# Altium integrated library WCAP-AIE8_rev15a.intlib: 24 symbols
Pins are listed as number, name and electrical type; pins without a type are passive.

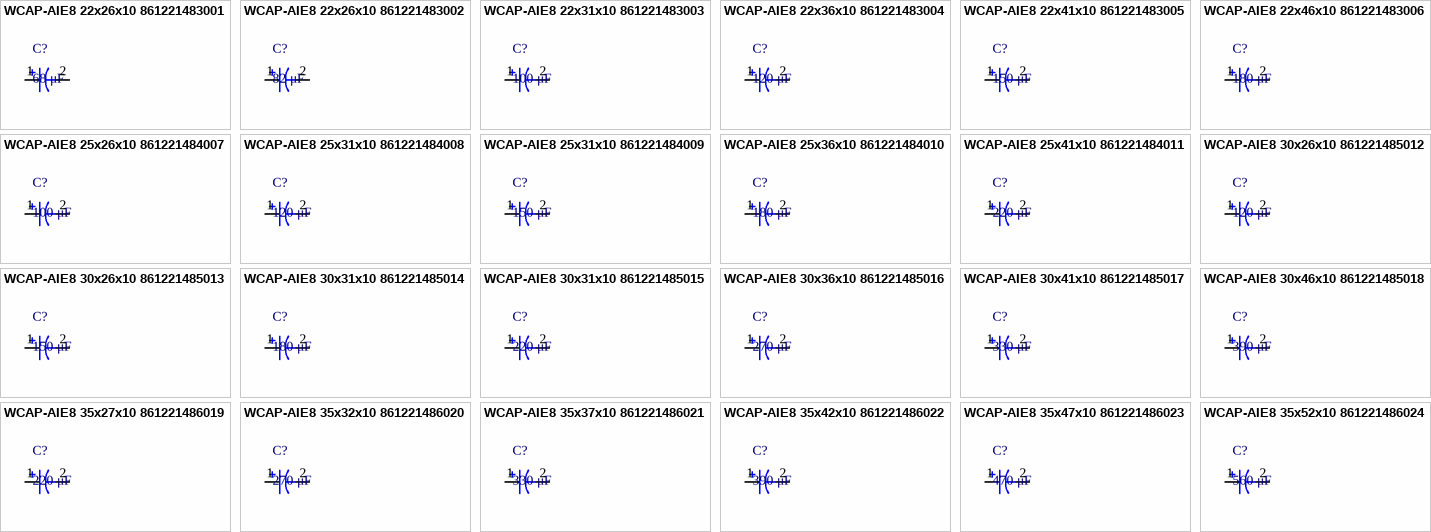
[diagram p0: symbols WCAP-AIE8 22x26x10 861221483001 to WCAP-AIE8 35x52x10 861221486024]

## WCAP-AIE8 22x26x10 861221483001
designator C?, comment 68 μF
WCAP-AIE8 Aluminum Electrolytic Capacitors , 68 μF; + / - 20%; 450 V , 22 x 26; Manufacturer: Wurth Elektronik; partNo: 861221483001; E-mail: libraries@we-online.com; Characteristics: Aluminum Electrolytic Capacitor; Recommended soldering: Wave; Operating temperature: –25 °C to +85 °C; Extended lifetime product series; Load life: 3000 h @ +85 °C; ComponentLink1Description: Manufacturer; ComponentLink1URL: http://www.we-online.com; ComponentLink2Description: Datasheet; ComponentLink2URL: http://katalog.we-online.de/pbs/datasheet/861221483001.pdf; Created by: Karrer Zheng; Created Date: 6/8/2015; Capacitance: 68 μF; Application: Medium and high voltage type range from 160V-450V used as primary side input filter in power supply, which can be used in general switching power supply, PC power supply and industrial computer power supply,server power supply, AC-DC converter, motor drive circuit DC storage filter, digital audio, digital TV, communication base station, DC-AC inverter, inverter power supply and converters etc
footprint WCAP-AIE8 22x26x10
pins: 1, 2

## WCAP-AIE8 22x26x10 861221483002
designator C?, comment 82 μF
WCAP-AIE8 Aluminum Electrolytic Capacitors , 82 μF; + / - 20%; 450 V , 22 x 26; Manufacturer: Wurth Elektronik; partNo: 861221483002; E-mail: libraries@we-online.com; Characteristics: Aluminum Electrolytic Capacitor; Recommended soldering: Wave; Operating temperature: –25 °C to +85 °C; Extended lifetime product series; Load life: 3000 h @ +85 °C; ComponentLink1Description: Manufacturer; ComponentLink1URL: http://www.we-online.com; ComponentLink2Description: Datasheet; ComponentLink2URL: http://katalog.we-online.de/pbs/datasheet/861221483002.pdf; Created by: Karrer Zheng; Created Date: 6/8/2015; Capacitance: 82 μF; Application: Medium and high voltage type range from 160V-450V used as primary side input filter in power supply, which can be used in general switching power supply, PC power supply and industrial computer power supply,server power supply, AC-DC converter, motor drive circuit DC storage filter, digital audio, digital TV, communication base station, DC-AC inverter, inverter power supply and converters etc
footprint WCAP-AIE8 22x26x10
pins: 1, 2

## WCAP-AIE8 22x31x10 861221483003
designator C?, comment 100 μF
WCAP-AIE8 Aluminum Electrolytic Capacitors , 100 μF; + / - 20%; 450 V , 22 x 31; Manufacturer: Wurth Elektronik; partNo: 861221483003; E-mail: libraries@we-online.com; Characteristics: Aluminum Electrolytic Capacitor; Recommended soldering: Wave; Operating temperature: –25 °C to +85 °C; Extended lifetime product series; Load life: 3000 h @ +85 °C; ComponentLink1Description: Manufacturer; ComponentLink1URL: http://www.we-online.com; ComponentLink2Description: Datasheet; ComponentLink2URL: http://katalog.we-online.de/pbs/datasheet/861221483003.pdf; Created by: Karrer Zheng; Created Date: 6/8/2015; Capacitance: 100 μF; Application: Medium and high voltage type range from 160V-450V used as primary side input filter in power supply, which can be used in general switching power supply, PC power supply and industrial computer power supply,server power supply, AC-DC converter, motor drive circuit DC storage filter, digital audio, digital TV, communication base station, DC-AC inverter, inverter power supply and converters etc
footprint WCAP-AIE8 22x31x10
pins: 1, 2

## WCAP-AIE8 22x36x10 861221483004
designator C?, comment 120 μF
WCAP-AIE8 Aluminum Electrolytic Capacitors , 120 μF; + / - 20%; 450 V , 22 x 36; Manufacturer: Wurth Elektronik; partNo: 861221483004; E-mail: libraries@we-online.com; Characteristics: Aluminum Electrolytic Capacitor; Recommended soldering: Wave; Operating temperature: –25 °C to +85 °C; Extended lifetime product series; Load life: 3000 h @ +85 °C; ComponentLink1Description: Manufacturer; ComponentLink1URL: http://www.we-online.com; ComponentLink2Description: Datasheet; ComponentLink2URL: http://katalog.we-online.de/pbs/datasheet/861221483004.pdf; Created by: Karrer Zheng; Created Date: 6/8/2015; Capacitance: 120 μF; Application: Medium and high voltage type range from 160V-450V used as primary side input filter in power supply, which can be used in general switching power supply, PC power supply and industrial computer power supply,server power supply, AC-DC converter, motor drive circuit DC storage filter, digital audio, digital TV, communication base station, DC-AC inverter, inverter power supply and converters etc
footprint WCAP-AIE8 22x36x10
pins: 1, 2

## WCAP-AIE8 22x41x10 861221483005
designator C?, comment 150 μF
WCAP-AIE8 Aluminum Electrolytic Capacitors , 150 μF; + / - 20%; 450 V , 22 x 41; Manufacturer: Wurth Elektronik; partNo: 861221483005; E-mail: libraries@we-online.com; Characteristics: Aluminum Electrolytic Capacitor; Recommended soldering: Wave; Operating temperature: –25 °C to +85 °C; Extended lifetime product series; Load life: 3000 h @ +85 °C; ComponentLink1Description: Manufacturer; ComponentLink1URL: http://www.we-online.com; ComponentLink2Description: Datasheet; ComponentLink2URL: http://katalog.we-online.de/pbs/datasheet/861221483005.pdf; Created by: Karrer Zheng; Created Date: 6/8/2015; Capacitance: 150 μF; Application: Medium and high voltage type range from 160V-450V used as primary side input filter in power supply, which can be used in general switching power supply, PC power supply and industrial computer power supply,server power supply, AC-DC converter, motor drive circuit DC storage filter, digital audio, digital TV, communication base station, DC-AC inverter, inverter power supply and converters etc
footprint WCAP-AIE8 22x41x10
pins: 1, 2

## WCAP-AIE8 22x46x10 861221483006
designator C?, comment 180 μF
WCAP-AIE8 Aluminum Electrolytic Capacitors , 180 μF; + / - 20%; 450 V , 22 x 46; Manufacturer: Wurth Elektronik; partNo: 861221483006; E-mail: libraries@we-online.com; Characteristics: Aluminum Electrolytic Capacitor; Recommended soldering: Wave; Operating temperature: –25 °C to +85 °C; Extended lifetime product series; Load life: 3000 h @ +85 °C; ComponentLink1Description: Manufacturer; ComponentLink1URL: http://www.we-online.com; ComponentLink2Description: Datasheet; ComponentLink2URL: http://katalog.we-online.de/pbs/datasheet/861221483006.pdf; Created by: Karrer Zheng; Created Date: 6/8/2015; Capacitance: 180 μF; Application: Medium and high voltage type range from 160V-450V used as primary side input filter in power supply, which can be used in general switching power supply, PC power supply and industrial computer power supply,server power supply, AC-DC converter, motor drive circuit DC storage filter, digital audio, digital TV, communication base station, DC-AC inverter, inverter power supply and converters etc
footprint WCAP-AIE8 22x46x10
pins: 1, 2

## WCAP-AIE8 25x26x10 861221484007
designator C?, comment 100 μF
WCAP-AIE8 Aluminum Electrolytic Capacitors , 100 μF; + / - 20%; 450 V , 25 x 26; Manufacturer: Wurth Elektronik; partNo: 861221484007; E-mail: libraries@we-online.com; Characteristics: Aluminum Electrolytic Capacitor; Recommended soldering: Wave; Operating temperature: –25 °C to +85 °C; Extended lifetime product series; Load life: 3000 h @ +85 °C; ComponentLink1Description: Manufacturer; ComponentLink1URL: http://www.we-online.com; ComponentLink2Description: Datasheet; ComponentLink2URL: http://katalog.we-online.de/pbs/datasheet/861221484007.pdf; Created by: Karrer Zheng; Created Date: 6/8/2015; Capacitance: 100 μF; Application: Medium and high voltage type range from 160V-450V used as primary side input filter in power supply, which can be used in general switching power supply, PC power supply and industrial computer power supply,server power supply, AC-DC converter, motor drive circuit DC storage filter, digital audio, digital TV, communication base station, DC-AC inverter, inverter power supply and converters etc
footprint WCAP-AIE8 25x26x10
pins: 1, 2

## WCAP-AIE8 25x31x10 861221484008
designator C?, comment 120 μF
WCAP-AIE8 Aluminum Electrolytic Capacitors , 120 μF; + / - 20%; 450 V , 25 x 31; Manufacturer: Wurth Elektronik; partNo: 861221484008; E-mail: libraries@we-online.com; Characteristics: Aluminum Electrolytic Capacitor; Recommended soldering: Wave; Operating temperature: –25 °C to +85 °C; Extended lifetime product series; Load life: 3000 h @ +85 °C; ComponentLink1Description: Manufacturer; ComponentLink1URL: http://www.we-online.com; ComponentLink2Description: Datasheet; ComponentLink2URL: http://katalog.we-online.de/pbs/datasheet/861221484008.pdf; Created by: Karrer Zheng; Created Date: 6/8/2015; Capacitance: 120 μF; Application: Medium and high voltage type range from 160V-450V used as primary side input filter in power supply, which can be used in general switching power supply, PC power supply and industrial computer power supply,server power supply, AC-DC converter, motor drive circuit DC storage filter, digital audio, digital TV, communication base station, DC-AC inverter, inverter power supply and converters etc
footprint WCAP-AIE8 25x31x10
pins: 1, 2

## WCAP-AIE8 25x31x10 861221484009
designator C?, comment 150 μF
WCAP-AIE8 Aluminum Electrolytic Capacitors , 150 μF; + / - 20%; 450 V , 25 x 31; Manufacturer: Wurth Elektronik; partNo: 861221484009; E-mail: libraries@we-online.com; Characteristics: Aluminum Electrolytic Capacitor; Recommended soldering: Wave; Operating temperature: –25 °C to +85 °C; Extended lifetime product series; Load life: 3000 h @ +85 °C; ComponentLink1Description: Manufacturer; ComponentLink1URL: http://www.we-online.com; ComponentLink2Description: Datasheet; ComponentLink2URL: http://katalog.we-online.de/pbs/datasheet/861221484009.pdf; Created by: Karrer Zheng; Created Date: 6/8/2015; Capacitance: 150 μF; Application: Medium and high voltage type range from 160V-450V used as primary side input filter in power supply, which can be used in general switching power supply, PC power supply and industrial computer power supply,server power supply, AC-DC converter, motor drive circuit DC storage filter, digital audio, digital TV, communication base station, DC-AC inverter, inverter power supply and converters etc
footprint WCAP-AIE8 25x31x10
pins: 1, 2

## WCAP-AIE8 25x36x10 861221484010
designator C?, comment 180 μF
WCAP-AIE8 Aluminum Electrolytic Capacitors , 180 μF; + / - 20%; 450 V , 25 x 36; Manufacturer: Wurth Elektronik; partNo: 861221484010; E-mail: libraries@we-online.com; Characteristics: Aluminum Electrolytic Capacitor; Recommended soldering: Wave; Operating temperature: –25 °C to +85 °C; Extended lifetime product series; Load life: 3000 h @ +85 °C; ComponentLink1Description: Manufacturer; ComponentLink1URL: http://www.we-online.com; ComponentLink2Description: Datasheet; ComponentLink2URL: http://katalog.we-online.de/pbs/datasheet/861221484010.pdf; Created by: Karrer Zheng; Created Date: 6/8/2015; Capacitance: 180 μF; Application: Medium and high voltage type range from 160V-450V used as primary side input filter in power supply, which can be used in general switching power supply, PC power supply and industrial computer power supply,server power supply, AC-DC converter, motor drive circuit DC storage filter, digital audio, digital TV, communication base station, DC-AC inverter, inverter power supply and converters etc
footprint WCAP-AIE8 25x36x10
pins: 1, 2

## WCAP-AIE8 25x41x10 861221484011
designator C?, comment 220 μF
WCAP-AIE8 Aluminum Electrolytic Capacitors , 220 μF; + / - 20%; 450 V , 25 x 41; Manufacturer: Wurth Elektronik; partNo: 861221484011; E-mail: libraries@we-online.com; Characteristics: Aluminum Electrolytic Capacitor; Recommended soldering: Wave; Operating temperature: –25 °C to +85 °C; Extended lifetime product series; Load life: 3000 h @ +85 °C; ComponentLink1Description: Manufacturer; ComponentLink1URL: http://www.we-online.com; ComponentLink2Description: Datasheet; ComponentLink2URL: http://katalog.we-online.de/pbs/datasheet/861221484011.pdf; Created by: Karrer Zheng; Created Date: 6/8/2015; Capacitance: 220 μF; Application: Medium and high voltage type range from 160V-450V used as primary side input filter in power supply, which can be used in general switching power supply, PC power supply and industrial computer power supply,server power supply, AC-DC converter, motor drive circuit DC storage filter, digital audio, digital TV, communication base station, DC-AC inverter, inverter power supply and converters etc
footprint WCAP-AIE8 25x41x10
pins: 1, 2

## WCAP-AIE8 30x26x10 861221485012
designator C?, comment 120 μF
WCAP-AIE8 Aluminum Electrolytic Capacitors , 120 μF; + / - 20%; 450 V , 30 x 26; Manufacturer: Wurth Elektronik; partNo: 861221485012; E-mail: libraries@we-online.com; Characteristics: Aluminum Electrolytic Capacitor; Recommended soldering: Wave; Operating temperature: –25 °C to +85 °C; Extended lifetime product series; Load life: 3000 h @ +85 °C; ComponentLink1Description: Manufacturer; ComponentLink1URL: http://www.we-online.com; ComponentLink2Description: Datasheet; ComponentLink2URL: http://katalog.we-online.de/pbs/datasheet/861221485012.pdf; Created by: Karrer Zheng; Created Date: 6/8/2015; Capacitance: 120 μF; Application: Medium and high voltage type range from 160V-450V used as primary side input filter in power supply, which can be used in general switching power supply, PC power supply and industrial computer power supply,server power supply, AC-DC converter, motor drive circuit DC storage filter, digital audio, digital TV, communication base station, DC-AC inverter, inverter power supply and converters etc
footprint WCAP-AIE8 30x26x10
pins: 1, 2

## WCAP-AIE8 30x26x10 861221485013
designator C?, comment 150 μF
WCAP-AIE8 Aluminum Electrolytic Capacitors , 150 μF; + / - 20%; 450 V , 30 x 26; Manufacturer: Wurth Elektronik; partNo: 861221485013; E-mail: libraries@we-online.com; Characteristics: Aluminum Electrolytic Capacitor; Recommended soldering: Wave; Operating temperature: –25 °C to +85 °C; Extended lifetime product series; Load life: 3000 h @ +85 °C; ComponentLink1Description: Manufacturer; ComponentLink1URL: http://www.we-online.com; ComponentLink2Description: Datasheet; ComponentLink2URL: http://katalog.we-online.de/pbs/datasheet/861221485013.pdf; Created by: Karrer Zheng; Created Date: 6/8/2015; Capacitance: 150 μF; Application: Medium and high voltage type range from 160V-450V used as primary side input filter in power supply, which can be used in general switching power supply, PC power supply and industrial computer power supply,server power supply, AC-DC converter, motor drive circuit DC storage filter, digital audio, digital TV, communication base station, DC-AC inverter, inverter power supply and converters etc
footprint WCAP-AIE8 30x26x10
pins: 1, 2

## WCAP-AIE8 30x31x10 861221485014
designator C?, comment 180 μF
WCAP-AIE8 Aluminum Electrolytic Capacitors , 180 μF; + / - 20%; 450 V , 30 x 31; Manufacturer: Wurth Elektronik; partNo: 861221485014; E-mail: libraries@we-online.com; Characteristics: Aluminum Electrolytic Capacitor; Recommended soldering: Wave; Operating temperature: –25 °C to +85 °C; Extended lifetime product series; Load life: 3000 h @ +85 °C; ComponentLink1Description: Manufacturer; ComponentLink1URL: http://www.we-online.com; ComponentLink2Description: Datasheet; ComponentLink2URL: http://katalog.we-online.de/pbs/datasheet/861221485014.pdf; Created by: Karrer Zheng; Created Date: 6/8/2015; Capacitance: 180 μF; Application: Medium and high voltage type range from 160V-450V used as primary side input filter in power supply, which can be used in general switching power supply, PC power supply and industrial computer power supply,server power supply, AC-DC converter, motor drive circuit DC storage filter, digital audio, digital TV, communication base station, DC-AC inverter, inverter power supply and converters etc
footprint WCAP-AIE8 30x31x10
pins: 1, 2

## WCAP-AIE8 30x31x10 861221485015
designator C?, comment 220 μF
WCAP-AIE8 Aluminum Electrolytic Capacitors , 220 μF; + / - 20%; 450 V , 30 x 31; Manufacturer: Wurth Elektronik; partNo: 861221485015; E-mail: libraries@we-online.com; Characteristics: Aluminum Electrolytic Capacitor; Recommended soldering: Wave; Operating temperature: –25 °C to +85 °C; Extended lifetime product series; Load life: 3000 h @ +85 °C; ComponentLink1Description: Manufacturer; ComponentLink1URL: http://www.we-online.com; ComponentLink2Description: Datasheet; ComponentLink2URL: http://katalog.we-online.de/pbs/datasheet/861221485015.pdf; Created by: Karrer Zheng; Created Date: 6/8/2015; Capacitance: 220 μF; Application: Medium and high voltage type range from 160V-450V used as primary side input filter in power supply, which can be used in general switching power supply, PC power supply and industrial computer power supply,server power supply, AC-DC converter, motor drive circuit DC storage filter, digital audio, digital TV, communication base station, DC-AC inverter, inverter power supply and converters etc
footprint WCAP-AIE8 30x31x10
pins: 1, 2

## WCAP-AIE8 30x36x10 861221485016
designator C?, comment 270 μF
WCAP-AIE8 Aluminum Electrolytic Capacitors , 270 μF; + / - 20%; 450 V , 30 x 36; Manufacturer: Wurth Elektronik; partNo: 861221485016; E-mail: libraries@we-online.com; Characteristics: Aluminum Electrolytic Capacitor; Recommended soldering: Wave; Operating temperature: –25 °C to +85 °C; Extended lifetime product series; Load life: 3000 h @ +85 °C; ComponentLink1Description: Manufacturer; ComponentLink1URL: http://www.we-online.com; ComponentLink2Description: Datasheet; ComponentLink2URL: http://katalog.we-online.de/pbs/datasheet/861221485016.pdf; Created by: Karrer Zheng; Created Date: 6/8/2015; Capacitance: 270 μF; Application: Medium and high voltage type range from 160V-450V used as primary side input filter in power supply, which can be used in general switching power supply, PC power supply and industrial computer power supply,server power supply, AC-DC converter, motor drive circuit DC storage filter, digital audio, digital TV, communication base station, DC-AC inverter, inverter power supply and converters etc
footprint WCAP-AIE8 30x36x10
pins: 1, 2

## WCAP-AIE8 30x41x10 861221485017
designator C?, comment 330 μF
WCAP-AIE8 Aluminum Electrolytic Capacitors , 330 μF; + / - 20%; 450 V , 30 x 41; Manufacturer: Wurth Elektronik; partNo: 861221485017; E-mail: libraries@we-online.com; Characteristics: Aluminum Electrolytic Capacitor; Recommended soldering: Wave; Operating temperature: –25 °C to +85 °C; Extended lifetime product series; Load life: 3000 h @ +85 °C; ComponentLink1Description: Manufacturer; ComponentLink1URL: http://www.we-online.com; ComponentLink2Description: Datasheet; ComponentLink2URL: http://katalog.we-online.de/pbs/datasheet/861221485017.pdf; Created by: Karrer Zheng; Created Date: 6/8/2015; Capacitance: 330 μF; Application: Medium and high voltage type range from 160V-450V used as primary side input filter in power supply, which can be used in general switching power supply, PC power supply and industrial computer power supply,server power supply, AC-DC converter, motor drive circuit DC storage filter, digital audio, digital TV, communication base station, DC-AC inverter, inverter power supply and converters etc
footprint WCAP-AIE8 30x41x10
pins: 1, 2

## WCAP-AIE8 30x46x10 861221485018
designator C?, comment 390 μF
WCAP-AIE8 Aluminum Electrolytic Capacitors , 390 μF; + / - 20%; 450 V , 30 x 46; Manufacturer: Wurth Elektronik; partNo: 861221485018; E-mail: libraries@we-online.com; Characteristics: Aluminum Electrolytic Capacitor; Recommended soldering: Wave; Operating temperature: –25 °C to +85 °C; Extended lifetime product series; Load life: 3000 h @ +85 °C; ComponentLink1Description: Manufacturer; ComponentLink1URL: http://www.we-online.com; ComponentLink2Description: Datasheet; ComponentLink2URL: http://katalog.we-online.de/pbs/datasheet/861221485018.pdf; Created by: Karrer Zheng; Created Date: 6/8/2015; Capacitance: 390 μF; Application: Medium and high voltage type range from 160V-450V used as primary side input filter in power supply, which can be used in general switching power supply, PC power supply and industrial computer power supply,server power supply, AC-DC converter, motor drive circuit DC storage filter, digital audio, digital TV, communication base station, DC-AC inverter, inverter power supply and converters etc
footprint WCAP-AIE8 30x46x10
pins: 1, 2

## WCAP-AIE8 35x27x10 861221486019
designator C?, comment 220 μF
WCAP-AIE8 Aluminum Electrolytic Capacitors , 220 μF; + / - 20%; 450 V , 35 x 27; Manufacturer: Wurth Elektronik; partNo: 861221486019; E-mail: libraries@we-online.com; Characteristics: Aluminum Electrolytic Capacitor; Recommended soldering: Wave; Operating temperature: –25 °C to +85 °C; Extended lifetime product series; Load life: 3000 h @ +85 °C; ComponentLink1Description: Manufacturer; ComponentLink1URL: http://www.we-online.com; ComponentLink2Description: Datasheet; ComponentLink2URL: http://katalog.we-online.de/pbs/datasheet/861221486019.pdf; Created by: Karrer Zheng; Created Date: 6/8/2015; Capacitance: 220 μF; Application: Medium and high voltage type range from 160V-450V used as primary side input filter in power supply, which can be used in general switching power supply, PC power supply and industrial computer power supply,server power supply, AC-DC converter, motor drive circuit DC storage filter, digital audio, digital TV, communication base station, DC-AC inverter, inverter power supply and converters etc
footprint WCAP-AIE8 35x27x10
pins: 1, 2

## WCAP-AIE8 35x32x10 861221486020
designator C?, comment 270 μF
WCAP-AIE8 Aluminum Electrolytic Capacitors , 270 μF; + / - 20%; 450 V , 35 x 32; Manufacturer: Wurth Elektronik; partNo: 861221486020; E-mail: libraries@we-online.com; Characteristics: Aluminum Electrolytic Capacitor; Recommended soldering: Wave; Operating temperature: –25 °C to +85 °C; Extended lifetime product series; Load life: 3000 h @ +85 °C; ComponentLink1Description: Manufacturer; ComponentLink1URL: http://www.we-online.com; ComponentLink2Description: Datasheet; ComponentLink2URL: http://katalog.we-online.de/pbs/datasheet/861221486020.pdf; Created by: Karrer Zheng; Created Date: 6/8/2015; Capacitance: 270 μF; Application: Medium and high voltage type range from 160V-450V used as primary side input filter in power supply, which can be used in general switching power supply, PC power supply and industrial computer power supply,server power supply, AC-DC converter, motor drive circuit DC storage filter, digital audio, digital TV, communication base station, DC-AC inverter, inverter power supply and converters etc
footprint WCAP-AIE8 35x32x10
pins: 1, 2

## WCAP-AIE8 35x37x10 861221486021
designator C?, comment 330 μF
WCAP-AIE8 Aluminum Electrolytic Capacitors , 330 μF; + / - 20%; 450 V , 35 x 37; Manufacturer: Wurth Elektronik; partNo: 861221486021; E-mail: libraries@we-online.com; Characteristics: Aluminum Electrolytic Capacitor; Recommended soldering: Wave; Operating temperature: –25 °C to +85 °C; Extended lifetime product series; Load life: 3000 h @ +85 °C; ComponentLink1Description: Manufacturer; ComponentLink1URL: http://www.we-online.com; ComponentLink2Description: Datasheet; ComponentLink2URL: http://katalog.we-online.de/pbs/datasheet/861221486021.pdf; Created by: Karrer Zheng; Created Date: 6/8/2015; Capacitance: 330 μF; Application: Medium and high voltage type range from 160V-450V used as primary side input filter in power supply, which can be used in general switching power supply, PC power supply and industrial computer power supply,server power supply, AC-DC converter, motor drive circuit DC storage filter, digital audio, digital TV, communication base station, DC-AC inverter, inverter power supply and converters etc
footprint WCAP-AIE8 35x37x10
pins: 1, 2

## WCAP-AIE8 35x42x10 861221486022
designator C?, comment 390 μF
WCAP-AIE8 Aluminum Electrolytic Capacitors , 390 μF; + / - 20%; 450 V , 35 x 42; Manufacturer: Wurth Elektronik; partNo: 861221486022; E-mail: libraries@we-online.com; Characteristics: Aluminum Electrolytic Capacitor; Recommended soldering: Wave; Operating temperature: –25 °C to +85 °C; Extended lifetime product series; Load life: 3000 h @ +85 °C; ComponentLink1Description: Manufacturer; ComponentLink1URL: http://www.we-online.com; ComponentLink2Description: Datasheet; ComponentLink2URL: http://katalog.we-online.de/pbs/datasheet/861221486022.pdf; Created by: Karrer Zheng; Created Date: 6/8/2015; Capacitance: 390 μF; Application: Medium and high voltage type range from 160V-450V used as primary side input filter in power supply, which can be used in general switching power supply, PC power supply and industrial computer power supply,server power supply, AC-DC converter, motor drive circuit DC storage filter, digital audio, digital TV, communication base station, DC-AC inverter, inverter power supply and converters etc
footprint WCAP-AIE8 35x42x10
pins: 1, 2

## WCAP-AIE8 35x47x10 861221486023
designator C?, comment 470 μF
WCAP-AIE8 Aluminum Electrolytic Capacitors , 470 μF; + / - 20%; 450 V , 35 x 47; Manufacturer: Wurth Elektronik; partNo: 861221486023; E-mail: libraries@we-online.com; Characteristics: Aluminum Electrolytic Capacitor; Recommended soldering: Wave; Operating temperature: –25 °C to +85 °C; Extended lifetime product series; Load life: 3000 h @ +85 °C; ComponentLink1Description: Manufacturer; ComponentLink1URL: http://www.we-online.com; ComponentLink2Description: Datasheet; ComponentLink2URL: http://katalog.we-online.de/pbs/datasheet/861221486023.pdf; Created by: Karrer Zheng; Created Date: 6/8/2015; Capacitance: 470 μF; Application: Medium and high voltage type range from 160V-450V used as primary side input filter in power supply, which can be used in general switching power supply, PC power supply and industrial computer power supply,server power supply, AC-DC converter, motor drive circuit DC storage filter, digital audio, digital TV, communication base station, DC-AC inverter, inverter power supply and converters etc
footprint WCAP-AIE8 35x47x10
pins: 1, 2

## WCAP-AIE8 35x52x10 861221486024
designator C?, comment 560 μF
WCAP-AIE8 Aluminum Electrolytic Capacitors , 560 μF; + / - 20%; 450 V , 35 x 52; Manufacturer: Wurth Elektronik; partNo: 861221486024; E-mail: libraries@we-online.com; Characteristics: Aluminum Electrolytic Capacitor; Recommended soldering: Wave; Operating temperature: –25 °C to +85 °C; Extended lifetime product series; Load life: 3000 h @ +85 °C; ComponentLink1Description: Manufacturer; ComponentLink1URL: http://www.we-online.com; ComponentLink2Description: Datasheet; ComponentLink2URL: http://katalog.we-online.de/pbs/datasheet/861221486024.pdf; Created by: Karrer Zheng; Created Date: 6/8/2015; Capacitance: 560 μF; Application: Medium and high voltage type range from 160V-450V used as primary side input filter in power supply, which can be used in general switching power supply, PC power supply and industrial computer power supply,server power supply, AC-DC converter, motor drive circuit DC storage filter, digital audio, digital TV, communication base station, DC-AC inverter, inverter power supply and converters etc
footprint WCAP-AIE8 35x52x10
pins: 1, 2